# Altium footprint library North POLE.PcbLib: 419 footprints (part 4 of 27)
Each footprint in its own frame and in the unit in brackets; x right, y up, seen from the top. Pads: shape width x height; smd on the part's side, far side on the other; paste and mask are expansions set on the pad; w line width, h text height; cw(c..) or ccw(c..) is an arc to the next point about the centre after c.
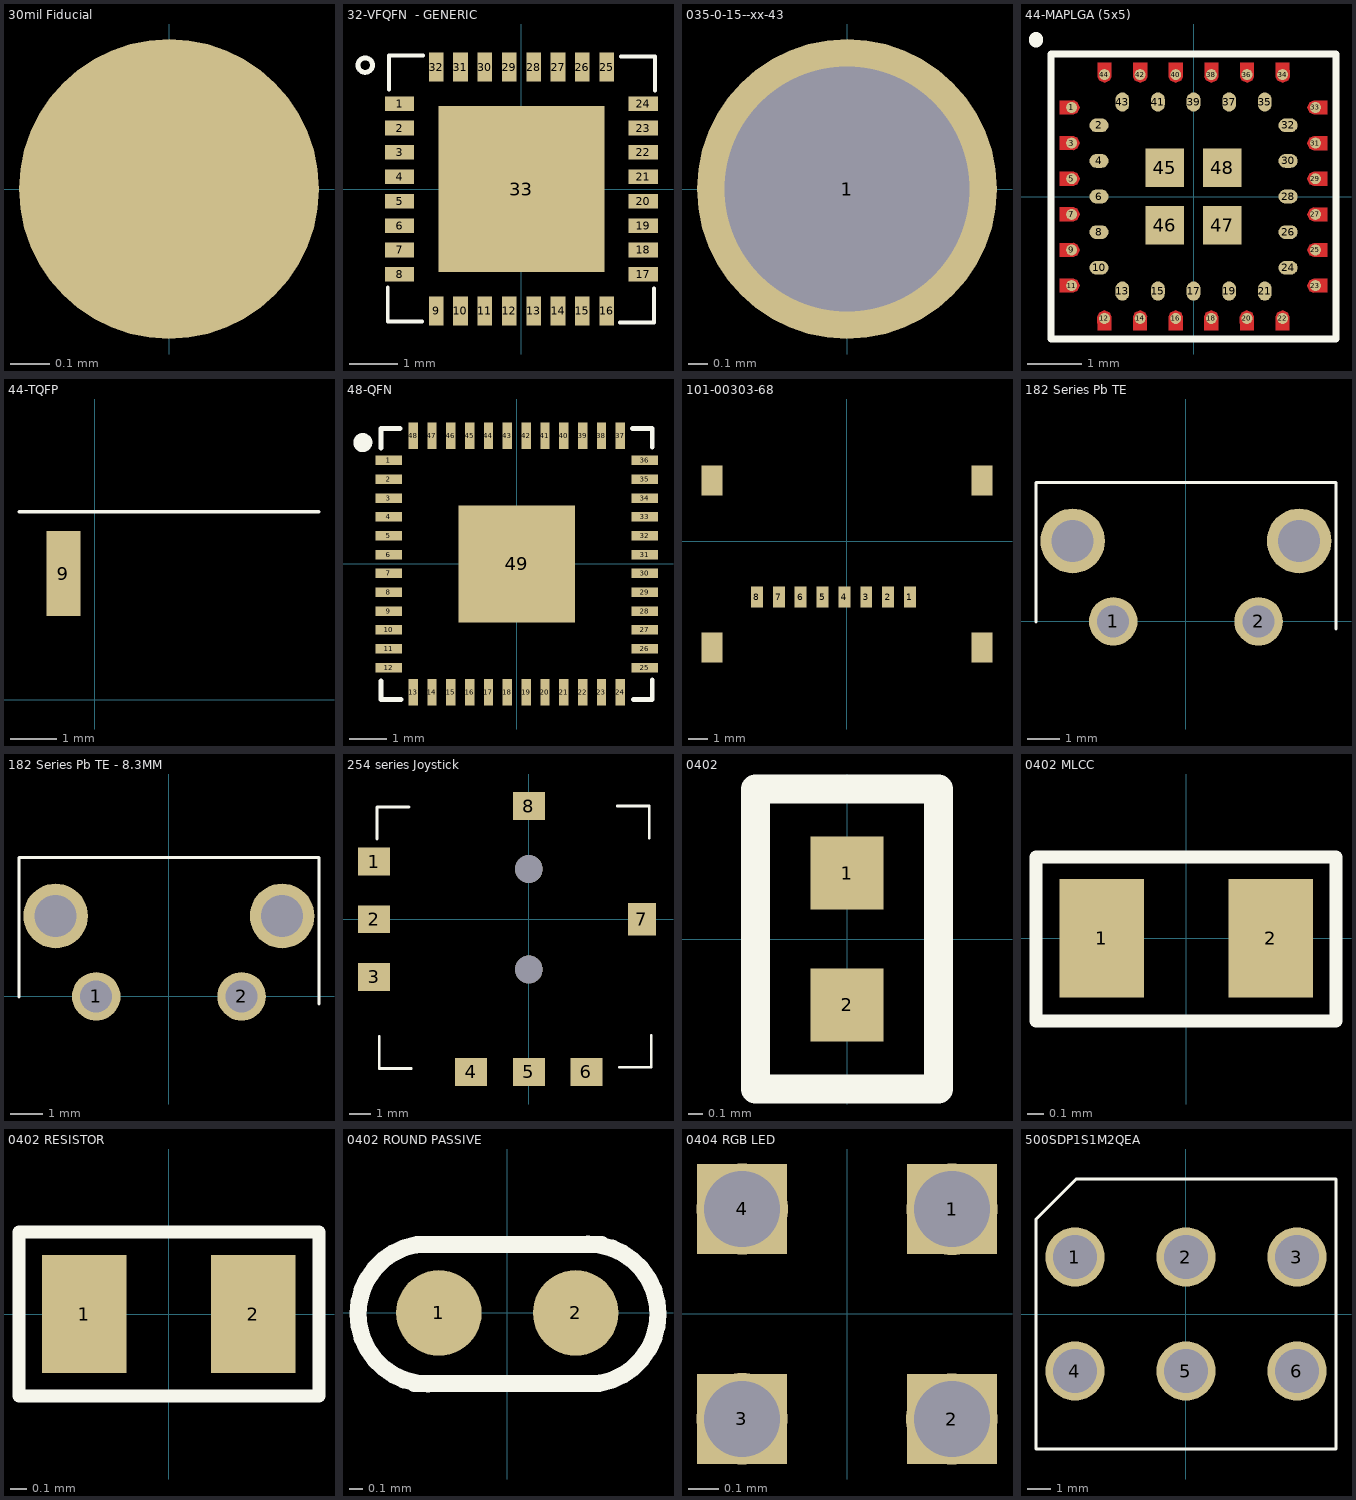
[diagram p3: the footprints below, top view; thin cyan lines are the x and y axes]

## 30mil Fiducial [mil]
pads (1):
  round 30 smd mask+3.15: ""(0,0)

## 32-VFQFN  - GENERIC [mm]
pads (33):
  rect 0.6x0.3 smd mask+0.05: 1(-2.5,1.75) 2(-2.5,1.25) 3(-2.5,0.75) 4(-2.5,0.25) 5(-2.5,-0.25) 6(-2.5,-0.75) 7(-2.5,-1.25) 8(-2.5,-1.75) 17(2.5,-1.75) 18(2.5,-1.25) 19(2.5,-0.75) 20(2.5,-0.25) 21(2.5,0.25) 22(2.5,0.75) 23(2.5,1.25) 24(2.5,1.75)
  rect 0.3x0.6 smd mask+0.05: 9(-1.75,-2.5) 10(-1.25,-2.5) 11(-0.75,-2.5) 12(-0.25,-2.5) 13(0.25,-2.5) 14(0.75,-2.5) 15(1.25,-2.5) 16(1.75,-2.5) 25(1.75,2.5) 26(1.25,2.5) 27(0.75,2.5) 28(0.25,2.5) 29(-0.25,2.5) 30(-0.75,2.5) 31(-1.25,2.5) 32(-1.75,2.5)
  rect 3.4x3.4 smd mask+0.05: 33(0,0)
Top Overlay:
  lines w0.076: -2.739,-2.02 -2.739,-2.718 -2.041,-2.718 ; -2.718,2.041 -2.718,2.739 -2.02,2.739 ; 2.02,-2.739 2.718,-2.739 2.718,-2.041 ; 2.041,2.718 2.739,2.718 2.739,2.02
  lines w0.1: -3.065,2.597 ccw(c-3.203,2.541) -3.061,2.586
3D body: height 1, standoff 0, extent -2.575,-2.575 2.575,2.575

## 035-0-15--xx-43 [mil]
pads (1):
  round 60 hole 49 mask+3.15: 1(0,0)
3D body: height 94, standoff 0, extent -25.54,-25.7 25.75,25.7

## 44-MAPLGA (5x5) [mm]
pads (48):
  round 0.2 smd paste+0 mask+0: 1(-2.225,1.625) 3(-2.225,0.975) 5(-2.225,0.325) 7(-2.225,-0.325) 9(-2.225,-0.975) 11(-2.225,-1.625) 12(-1.625,-2.225) 14(-0.975,-2.225) 16(-0.325,-2.225) 18(0.325,-2.225) 20(0.975,-2.225) 22(1.625,-2.225) 23(2.225,-1.625) 25(2.225,-0.975) 27(2.225,-0.325) 29(2.225,0.325) 31(2.225,0.975) 33(2.225,1.625) 34(1.625,2.225) 36(0.975,2.225) 38(0.325,2.225) 40(-0.325,2.225) 42(-0.975,2.225) 44(-1.625,2.225)
  oval 0.35x0.25 smd paste-0.01 mask+0.05: 2(-1.725,1.3) 4(-1.725,0.65) 6(-1.725,0) 8(-1.725,-0.65) 10(-1.725,-1.3) 24(1.725,-1.3) 26(1.725,-0.65) 28(1.725,0) 30(1.725,0.65) 32(1.725,1.3)
  oval 0.25x0.35 smd paste-0.01 mask+0.05: 13(-1.3,-1.725) 15(-0.65,-1.725) 17(0,-1.725) 19(0.65,-1.725) 21(1.3,-1.725) 35(1.3,1.725) 37(0.65,1.725) 39(0,1.725) 41(-0.65,1.725) 43(-1.3,1.725)
  rect 0.7x0.7 smd mask+0.05: 45(-0.525,0.525) 46(-0.525,-0.525) 47(0.525,-0.525) 48(0.525,0.525)
Top Layer:
  region: -2.44,-0.199 -2.19,-0.197 -2.12,-0.226 -2.08,-0.324 -2.12,-0.422 -2.19,-0.451 -2.19,-0.449 -2.44,-0.449
  region: -2.44,0.451 -2.19,0.453 -2.12,0.424 -2.08,0.326 -2.12,0.228 -2.19,0.199 -2.19,0.201 -2.44,0.201
  region: -2.44,1.101 -2.19,1.103 -2.12,1.074 -2.08,0.976 -2.12,0.878 -2.19,0.849 -2.19,0.851 -2.44,0.851
  region: -2.44,-0.849 -2.19,-0.847 -2.12,-0.876 -2.08,-0.974 -2.12,-1.072 -2.19,-1.101 -2.19,-1.099 -2.44,-1.099
  region: -2.44,-1.499 -2.19,-1.497 -2.12,-1.526 -2.08,-1.624 -2.12,-1.722 -2.19,-1.751 -2.19,-1.749 -2.44,-1.749
  region: -2.44,1.751 -2.19,1.753 -2.12,1.724 -2.08,1.626 -2.12,1.528 -2.19,1.499 -2.19,1.501 -2.44,1.501
  region: -0.199,2.44 -0.197,2.19 -0.226,2.12 -0.324,2.08 -0.422,2.12 -0.451,2.19 -0.449,2.19 -0.449,2.44
  region: 0.451,2.44 0.453,2.19 0.424,2.12 0.326,2.08 0.228,2.12 0.199,2.19 0.201,2.19 0.201,2.44
  region: 1.101,2.44 1.103,2.19 1.074,2.12 0.976,2.08 0.878,2.12 0.849,2.19 0.851,2.19 0.851,2.44
  region: -0.849,2.44 -0.847,2.19 -0.876,2.12 -0.974,2.08 -1.072,2.12 -1.101,2.19 -1.099,2.19 -1.099,2.44
  region: -1.499,2.44 -1.497,2.19 -1.526,2.12 -1.624,2.08 -1.722,2.12 -1.751,2.19 -1.749,2.19 -1.749,2.44
  region: 1.751,2.44 1.753,2.19 1.724,2.12 1.626,2.08 1.528,2.12 1.499,2.19 1.501,2.19 1.501,2.44
  region: 2.44,0.199 2.19,0.197 2.12,0.226 2.08,0.324 2.12,0.422 2.19,0.451 2.19,0.449 2.44,0.449
  region: 2.44,-0.451 2.19,-0.453 2.12,-0.424 2.08,-0.326 2.12,-0.228 2.19,-0.199 2.19,-0.201 2.44,-0.201
  region: 2.44,-1.101 2.19,-1.103 2.12,-1.074 2.08,-0.976 2.12,-0.878 2.19,-0.849 2.19,-0.851 2.44,-0.851
  region: 2.44,0.849 2.19,0.847 2.12,0.876 2.08,0.974 2.12,1.072 2.19,1.101 2.19,1.099 2.44,1.099
  region: 2.44,1.499 2.19,1.497 2.12,1.526 2.08,1.624 2.12,1.722 2.19,1.751 2.19,1.749 2.44,1.749
  region: 2.44,-1.751 2.19,-1.753 2.12,-1.724 2.08,-1.626 2.12,-1.528 2.19,-1.499 2.19,-1.501 2.44,-1.501
  region: -1.751,-2.44 -1.753,-2.19 -1.724,-2.12 -1.626,-2.08 -1.528,-2.12 -1.499,-2.19 -1.501,-2.19 -1.501,-2.44
  region: 1.499,-2.44 1.497,-2.19 1.526,-2.12 1.624,-2.08 1.722,-2.12 1.751,-2.19 1.749,-2.19 1.749,-2.44
  region: 0.849,-2.44 0.847,-2.19 0.876,-2.12 0.974,-2.08 1.072,-2.12 1.101,-2.19 1.099,-2.19 1.099,-2.44
  region: -1.101,-2.44 -1.103,-2.19 -1.074,-2.12 -0.976,-2.08 -0.878,-2.12 -0.849,-2.19 -0.851,-2.19 -0.851,-2.44
  region: -0.451,-2.44 -0.453,-2.19 -0.424,-2.12 -0.326,-2.08 -0.228,-2.12 -0.199,-2.19 -0.201,-2.19 -0.201,-2.44
  region: 0.199,-2.44 0.197,-2.19 0.226,-2.12 0.324,-2.08 0.422,-2.12 0.451,-2.19 0.449,-2.19 0.449,-2.44
Top Overlay:
  lines w0.127: -2.6,-2.6 -2.6,2.6 2.6,2.6 2.6,-2.6 -2.6,-2.6
  lines w0.254: -2.875,2.85 -2.875,2.875
3D body: height 1, standoff 0, extent -2.5,-2.5 2.5,2.5

## 44-TQFP [mm]
pads (1):
  rect 0.74x1.85 smd mask+0.08: 9(-0.686,2.743)
Top Overlay:
  lines w0.076: -1.651,4.089 4.886,4.089

## 48-QFN [mm]
pads (49):
  rect 0.7x0.25 smd mask+0.08: 1(-3.4,2.75) 2(-3.4,2.25) 3(-3.4,1.75) 4(-3.4,1.25) 5(-3.4,0.75) 6(-3.4,0.25) 7(-3.4,-0.25) 8(-3.4,-0.75) 9(-3.4,-1.25) 10(-3.4,-1.75) 11(-3.4,-2.25) 12(-3.4,-2.75) 25(3.4,-2.75) 26(3.4,-2.25) 27(3.4,-1.75) 28(3.4,-1.25) 29(3.4,-0.75) 30(3.4,-0.25) 31(3.4,0.25) 32(3.4,0.75) 33(3.4,1.25) 34(3.4,1.75) 35(3.4,2.25) 36(3.4,2.75)
  rect 0.25x0.7 smd mask+0.08: 13(-2.75,-3.4) 14(-2.25,-3.4) 15(-1.75,-3.4) 16(-1.25,-3.4) 17(-0.75,-3.4) 18(-0.25,-3.4) 19(0.25,-3.4) 20(0.75,-3.4) 21(1.25,-3.4) 22(1.75,-3.4) 23(2.25,-3.4) 24(2.75,-3.4) 37(2.75,3.4) 38(2.25,3.4) 39(1.75,3.4) 40(1.25,3.4) 41(0.75,3.4) 42(0.25,3.4) 43(-0.25,3.4) 44(-0.75,3.4) 45(-1.25,3.4) 46(-1.75,3.4) 47(-2.25,3.4) 48(-2.75,3.4)
  rect 3.1x3.1 smd mask+0.08: 49(0,0)
Top Overlay:
  lines w0.127: -3.6,-3.1 -3.6,-3.6 -3.075,-3.6 ; -3.6,3.075 -3.6,3.6 -3.1,3.6 ; 3.075,3.6 3.6,3.6 3.6,3.1 ; 3.1,-3.6 3.6,-3.6 3.6,-3.075
  lines w0.25: -4.107,3.349 ccw(c-4.086,3.223) -4.1,3.35
3D body: height 1, standoff 0, extent -3.5,-3.5 3.5,3.5

## 101-00303-68 [mm]
pads (12):
  rect 0.6x1.05 smd mask+0.08: 1(3.17,-2.82) 2(2.07,-2.82) 3(0.97,-2.82) 4(-0.13,-2.82) 5(-1.23,-2.82) 6(-2.33,-2.82) 7(-3.43,-2.82) 8(-4.53,-2.82)
  rect 1.05x1.5 smd mask+0.08: ""(-6.8,-5.35) ""(-6.8,3.05) ""(6.8,-5.35) ""(6.8,3.05)
3D body: height 1.8, standoff 0, extent -6.8,-6.65 6.8,6.65

## 182 Series Pb TE [mm]
pads (4):
  round 1.5 hole 0.99 mask+0.08: 1(-2.25,0) 2(2.25,0)
  round 2 hole 1.3 mask+0.08: ""(-3.505,2.49) ""(3.505,2.49)
Top Overlay:
  lines w0.1: -4.641,-0.015 -4.641,4.303 4.646,4.303 4.646,-0.229
3D body: height 7, standoff -3.52, extent -4.12,-3.124 4.288,4.026

## 182 Series Pb TE - 8.3MM [mm]
pads (4):
  round 1.5 hole 0.99 mask+0.08: 1(-2.25,0) 2(2.25,0)
  round 2 hole 1.3 mask+0.08: ""(-3.505,2.49) ""(3.505,2.49)
Top Overlay:
  lines w0.1: -4.641,-0.015 -4.641,4.303 4.646,4.303 4.646,-0.229
3D body: height 7, standoff -3.52, extent -4.12,-8.306 4.288,4.051

## 254 series Joystick [mm]
pads (10):
  rect 1.5x1.3 smd: 1(-7.25,2.7) 2(-7.25,0) 3(-7.25,-2.7) 4(-2.7,-7.15) 5(0,-7.15) 6(2.7,-7.15) 8(0,5.3)
  rect 1.3x1.5 smd: 7(5.3,0)
  round 1.3 hole 1.3 unplated mask+0.08: ""(0,-2.35) ""(0,2.35)
Top Overlay:
  lines w0.127: -7.112,3.759 -7.112,5.258 -5.613,5.258 ; -7.01,-5.486 -7.01,-6.985 -5.512,-6.985 ; 4.14,5.309 5.639,5.309 5.639,3.81 ; 4.242,-6.934 5.74,-6.934 5.74,-5.436
3D body: height 5, standoff 0, extent -6.579,-6.477 5.207,5.004
3D body: height 12, standoff 0, extent -0.744,-0.748 0.75,0.749

## 0402 [mil]
pads (2):
  rect 20x20 smd paste+0 mask+5: 1(0,18) 2(0,-18)
Top Overlay:
  lines w8: -25,-41 25,-41 25,41 -25,41 -25,-41

## 0402 MLCC [mm]
pads (2):
  rect 0.5x0.7 smd mask+0.08: 1(-0.5,0) 2(0.5,0)
Top Overlay:
  lines w0.076: -0.889,-0.491 0.887,-0.491 0.887,0.482 -0.889,0.482 -0.889,-0.491
3D body: height 0.5, standoff 0, extent -0.48,-0.244 0.52,0.256

## 0402 RESISTOR [mm]
pads (2):
  rect 0.5x0.7 smd mask+0.08: 1(-0.5,0) 2(0.5,0)
Top Overlay:
  lines w0.076: -0.886,-0.486 -0.886,0.487 0.89,0.487 0.89,-0.486 -0.886,-0.486
3D body: height 0.25, standoff 0, extent -0.503,-0.229 0.497,0.271

## 0402 ROUND PASSIVE [mil]
pads (2):
  round 25 smd: 1(-20,0) 2(20,0)
Top Overlay:
  lines w5: -27.1,-20.6 26.8,-20.6 ; -26.71,19.93 ccw(c-23.15,-0.27) -23.19,-20.79 ; -26.4,20 27.5,20 ; 23.59,20.19 cw(c23.55,-0.33) 27.11,-20.53

## 0404 RGB LED [mm]
pads (4):
  rect 0.3x0.3 smd mask+0.05: 1(0.35,0.35) 2(0.35,-0.35) 3(-0.35,-0.35) 4(-0.35,0.35)
via 0.35,-0.35 diameter 0.305 hole 0.254
via -0.35,-0.35 diameter 0.305 hole 0.254
via 0.35,0.35 diameter 0.305 hole 0.254
via -0.35,0.35 diameter 0.305 hole 0.254
3D body: height 0.26, standoff 0.1, extent -0.15,0.1 0.15,0.2
3D body: height 0.26, standoff 0.1, extent -0.15,-0.2 0.15,-0.1
3D body: height 0.26, standoff 0.1, extent -0.15,-0.05 0.15,0.05
3D body: height 0.25, standoff 0, extent -0.5,-0.5 0.5,0.5

## 500SDP1S1M2QEA [mm]
pads (6):
  round 2.5 hole 1.85 mask+0.04: 1(-4.699,2.413) 2(0,2.413) 3(4.699,2.413) 4(-4.699,-2.413) 5(0,-2.413) 6(4.699,-2.413)
Top Overlay:
  lines w0.127: -6.35,-5.715 6.35,-5.715 6.35,5.715 -4.648,5.715 -6.35,4.013 -6.35,-5.715
3D body: height 14.27, standoff -5.03, extent -6.35,-5.715 6.35,5.715